# Altium footprint library BuoyLoRaNode.PcbLib: 20 footprints (part 2 of 2)
Each footprint in its own frame and in the unit in brackets; x right, y up, seen from the top. Pads: shape width x height; smd on the part's side, far side on the other; paste and mask are expansions set on the pad; w line width, h text height; cw(c..) or ccw(c..) is an arc to the next point about the centre after c.
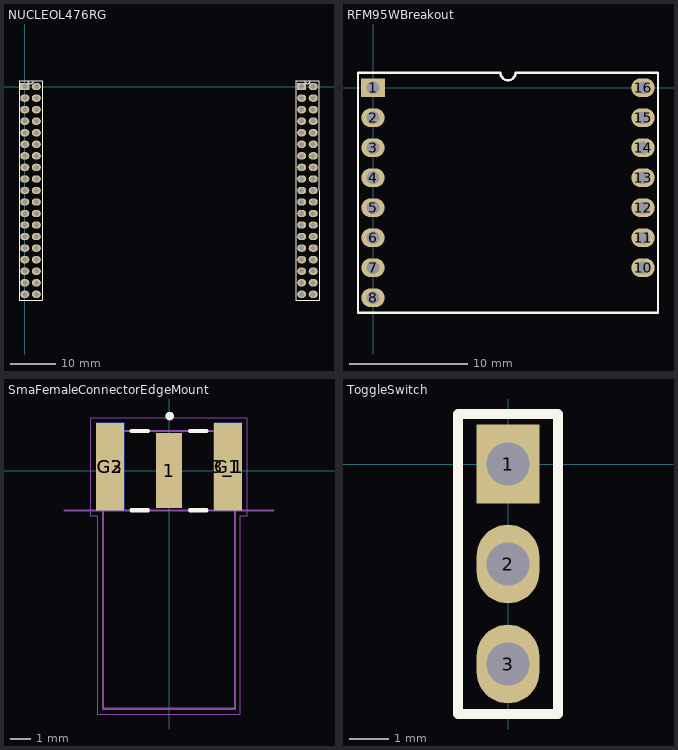
[diagram p1: the footprints below, top view; thin cyan lines are the x and y axes]

## NUCLEOL476RG [mm]
pads (76):
  rect 2x1.6 hole 1.1: CN7_1(0,0) CN10_1(60.96,0)
  oval 2x1.6 hole 1.1: CN7_2(2.54,0) CN7_3(0,-2.54) CN7_4(2.54,-2.54) CN7_5(0,-5.08) CN7_6(2.54,-5.08) CN7_7(0,-7.62) CN7_8(2.54,-7.62) CN7_9(0,-10.16) CN7_10(2.54,-10.16) CN7_11(0,-12.7) CN7_12(2.54,-12.7) CN7_13(0,-15.24) CN7_14(2.54,-15.24) CN7_15(0,-17.78) CN7_16(2.54,-17.78) CN7_17(0,-20.32) CN7_18(2.54,-20.32) CN7_19(0,-22.86) CN7_20(2.54,-22.86) CN7_21(0,-25.4) CN7_22(2.54,-25.4) CN7_23(0,-27.94) CN7_24(2.54,-27.94) CN7_25(0,-30.48) CN7_26(2.54,-30.48) CN7_27(0,-33.02) CN7_28(2.54,-33.02) CN7_29(0,-35.56) CN7_30(2.54,-35.56) CN7_31(0,-38.1) CN7_32(2.54,-38.1) CN7_33(0,-40.64) CN7_34(2.54,-40.64) CN7_35(0,-43.18) CN7_36(2.54,-43.18) CN7_37(0,-45.72) CN7_38(2.54,-45.72) CN10_2(63.5,0) CN10_3(60.96,-2.54) CN10_4(63.5,-2.54) CN10_5(60.96,-5.08) CN10_6(63.5,-5.08) CN10_7(60.96,-7.62) CN10_8(63.5,-7.62) CN10_9(60.96,-10.16) CN10_10(63.5,-10.16) CN10_11(60.96,-12.7) CN10_12(63.5,-12.7) CN10_13(60.96,-15.24) CN10_14(63.5,-15.24) CN10_15(60.96,-17.78) CN10_16(63.5,-17.78) CN10_17(60.96,-20.32) CN10_18(63.5,-20.32) CN10_19(60.96,-22.86) CN10_20(63.5,-22.86) CN10_21(60.96,-25.4) CN10_22(63.5,-25.4) CN10_23(60.96,-27.94) CN10_24(63.5,-27.94) CN10_25(60.96,-30.48) CN10_26(63.5,-30.48) CN10_27(60.96,-33.02) CN10_28(63.5,-33.02) CN10_29(60.96,-35.56) CN10_30(63.5,-35.56) CN10_31(60.96,-38.1) CN10_32(63.5,-38.1) CN10_33(60.96,-40.64) CN10_34(63.5,-40.64) CN10_35(60.96,-43.18) CN10_36(63.5,-43.18) CN10_37(60.96,-45.72) CN10_38(63.5,-45.72)
Top Overlay:
  lines w0.2: -1.27,-46.99 3.81,-46.99 3.81,1.27 0.635,1.27 ccw(c1.27,1.27) 1.905,1.27 -1.27,1.27 -1.27,-46.99 ; 59.69,-46.99 64.77,-46.99 64.77,1.27 61.595,1.27 ccw(c62.23,1.27) 62.865,1.27 59.69,1.27 59.69,-46.99
3D body "20PinFemaleHeader254mm.stp": height 9.51, standoff -3.93, extent -1.27,-24.384 3.683,1.524
3D body "20PinFemaleHeader254mm.stp": height 9.51, standoff -3.93, extent 59.69,-24.384 64.643,1.524
3D body "NUCLEO-60-F401-without-programmer.step": height 22.49, standoff 2.22, extent -3.25,-50.896 66.75,6.604
3D body "20PinFemaleHeader254mm.stp": height 9.51, standoff -3.93, extent -1.27,-49.784 3.683,-23.876
3D body "20PinFemaleHeader254mm.stp": height 9.51, standoff -3.93, extent 59.69,-49.784 64.643,-23.876

## RFM95WBreakout [mm]
pads (15):
  rect 2x1.6 hole 1.1: 1(0,0)
  oval 2x1.6 hole 1.1: 2(0,-2.54) 3(0,-5.08) 4(0,-7.62) 5(0,-10.16) 6(0,-12.7) 7(0,-15.24) 8(0,-17.78) 10(22.86,-15.24) 11(22.86,-12.7) 12(22.86,-10.16) 13(22.86,-7.62) 14(22.86,-5.08) 15(22.86,-2.54) 16(22.86,0)
Top Overlay:
  lines w0.2: -1.27,-19.05 24.13,-19.05 24.13,1.27 12.065,1.27 cw(c11.43,1.27) 10.795,1.27 -1.27,1.27 -1.27,-19.05
3D body "MaleSMAStraightPlug.stp": height 18.96, standoff 11.04, extent 15.825,-57.457 24.975,-30
3D body "8PinFemaleHeader.stp": height 9.51, standoff -2.15, extent -1.27,-19.304 1.143,1.524
3D body "RFM95W.step": height 18.18, standoff 2.3, extent -3.556,-34.292 27.444,2.032
3D body "7PinFemaleHeader.stp": height 9.51, standoff -2.15, extent 21.59,-16.764 24.003,1.524

## SmaFemaleConnectorEdgeMount [mm]
pads (5):
  rect 1.27x3.6 smd: 1(0,0)
  rect 1.35x4.2 smd: 3_1(2.825,0.2) G3(-2.825,0.2)
  rect 1.35x4.2 smd far side: G1(2.825,0.2) G2(-2.825,0.2)
Top Overlay:
  circle w0.2: c0.03,2.62 r0.1
  lines w0.2: -1.8,-1.9 -1,-1.9 ; -1.8,1.91 -1,1.91 ; 1,-1.9 1.8,-1.9 ; 1,1.91 1.8,1.91
Mechanical 13:
  circle w0.2: c0.03,2.62 r0.1
  lines w0.1: -5,-1.9 -3.165,-1.9 ; 5,-1.9 3.165,-1.9 ; -3.165,-1.9 -3.175,1.91 3.175,1.91 3.165,-1.9 ; -3.165,-1.9 3.165,-1.9 ; -3.165,-1.9 -3.165,-11.42 3.165,-11.42 3.165,-1.9
  text "PCB EDGE" at 4.304,-1.702 h0.61
Mechanical 15:
  lines w0.05: -3.75,-2.15 -3.75,2.55 3.75,2.55 3.75,-2.15 3.415,-2.15 3.415,-11.67 -3.415,-11.67 -3.415,-2.15 -3.75,-2.15
3D body "FemaleSMAEdgeMount.STEP": height 3.17, standoff -3.17, extent -3.175,-11.42 3.175,1.91

## ToggleSwitch [mm]
pads (3):
  rect 1.6x2 hole 1.1: 1(0,0)
  oval 1.6x2 hole 1.1: 2(0,-2.54) 3(0,-5.08)
Top Overlay:
  lines w0.254: -1.27,-6.35 -1.27,1.27 1.27,1.27 1.27,-6.35 -1.016,-6.35 -1.27,-6.35